# Altium footprint library ConnectMedical.PcbLib: 93 footprints (part 5 of 6)
Each footprint in its own frame and in the unit in brackets; x right, y up, seen from the top. Pads: shape width x height; smd on the part's side, far side on the other; paste and mask are expansions set on the pad; w line width, h text height; cw(c..) or ccw(c..) is an arc to the next point about the centre after c.
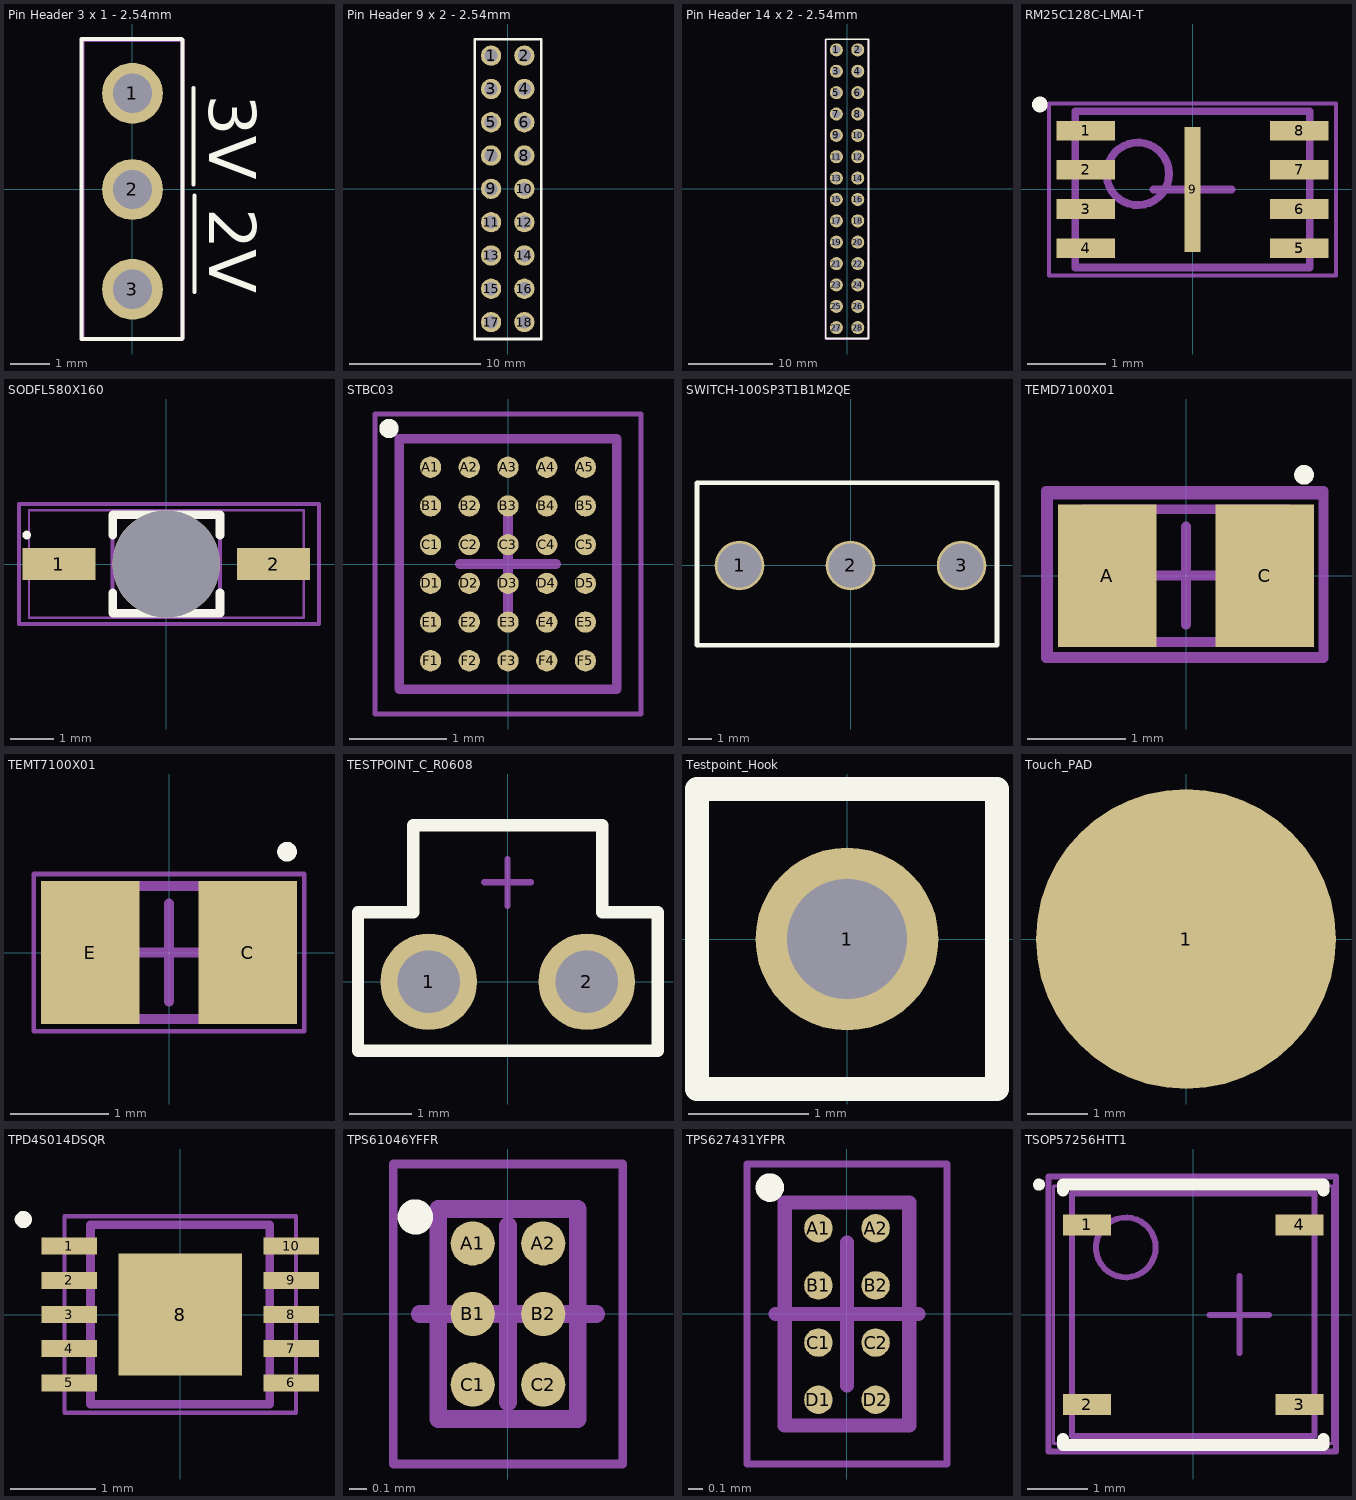
[diagram p4: the footprints below, top view; thin cyan lines are the x and y axes]

## Pin Header 3 x 1 - 2.54mm [mm] "Pin Header 3 X 1 TH 2.54mm Pitch"
pads (3):
  round 1.55 hole 1 paste-3 mask+0.1: 1(0,2.45) 2(0,0) 3(0,-2.54)
Top Overlay:
  lines w0.1: 1.549,0.127 1.549,2.591 ; 1.575,-2.616 1.575,-0.152 ; -1.295,-3.81 1.245,-3.81 1.27,-3.785 1.27,-3.302 1.27,3.81 1.245,3.835 -1.295,3.835 -1.295,-3.81
  text "3V" at 1.956,2.413 h1.2
  text "2V" at 1.956,-0.483 h1.2
Mechanical 14:
  lines w0.1: -1.27,-3.81 -1.27,3.81 1.27,3.81 1.27,-3.81 -1.27,-3.81
  text "'.Designator'" at 0.33,-2.286 h0.76
3D body "STEP-61300311121-rev1.stp": height 8.67, standoff -2.87, extent -1.27,-3.81 1.27,3.81

## Pin Header 9 x 2 - 2.54mm [mm] "Pin Header 9 x 2 TH 2.54mm Pitch"
pads (18):
  round 1.55 hole 1 paste-3 mask+0.1: 1(-1.27,10.16) 2(1.27,10.16) 3(-1.27,7.62) 4(1.27,7.62) 5(-1.27,5.08) 6(1.27,5.08) 7(-1.27,2.54) 8(1.27,2.54) 9(-1.27,0) 10(1.27,0) 11(-1.27,-2.54) 12(1.27,-2.54) 13(-1.27,-5.08) 14(1.27,-5.08) 15(-1.27,-7.62) 16(1.27,-7.62) 17(-1.27,-10.16) 18(1.27,-10.16)
Top Overlay:
  lines w0.2: -2.525,-11.45 2.55,-11.45 2.55,10.015 2.55,11.425 -2.525,11.425 -2.525,-3.01 -2.525,-11.45
Mechanical 14:
  lines w0.1: -2.515,-11.43 2.565,-11.43 2.565,11.43 -2.515,11.43 -2.515,-11.43
  text "'.Designator'" at 0.254,-4.089 h0.76
3D body "Pin Header 9 x 2 TH 2.54mm Pitch.stp": height 8.91, standoff -2.52, extent -2.515,-11.435 2.565,11.425

## Pin Header 14 x 2 - 2.54mm [mm] "Pin Header 14 x 2 TH 2.54mm Pitch"
pads (28):
  round 1.55 hole 1 paste-3 mask+0.1: 1(-1.27,16.51) 2(1.27,16.51) 3(-1.27,13.97) 4(1.27,13.97) 5(-1.27,11.43) 6(1.27,11.43) 7(-1.27,8.89) 8(1.27,8.89) 9(-1.27,6.35) 10(1.27,6.35) 11(-1.27,3.81) 12(1.27,3.81) 13(-1.27,1.27) 14(1.27,1.27) 15(-1.27,-1.27) 16(1.27,-1.27) 17(-1.27,-3.81) 18(1.27,-3.81) 19(-1.27,-6.35) 20(1.27,-6.35) 21(-1.27,-8.89) 22(1.27,-8.89) 23(-1.27,-11.43) 24(1.27,-11.43) 25(-1.27,-13.97) 26(1.27,-13.97) 27(-1.27,-16.51) 28(1.27,-16.51)
Top Overlay:
  lines w0.2: -2.525,-17.8 2.55,-17.8 2.55,16.365 2.55,17.775 -2.525,17.775 -2.525,3.34 -2.525,-17.8
Mechanical 14:
  lines w0.1: -2.565,-17.831 -2.565,17.78 -2.54,17.805 2.54,17.805 2.54,17.729 2.54,-17.856 -2.54,-17.856 -2.565,-17.831
  text "'.Designator'" at 0.279,-4.597 h0.76
3D body "Pin Header 14 x 2 TH 2.54mm Pitch.stp": height 8.91, standoff -2.52, extent -2.515,-17.785 2.565,17.775

## RM25C128C-LMAI-T [mm] "IC EEPROM 128KBIT 10MHZ 8DFN"
height 0.6
pads (9):
  rect 0.75x0.25 smd: 1(-1.365,0.75) 2(-1.365,0.25) 3(-1.365,-0.25) 4(-1.365,-0.75) 5(1.365,-0.75) 6(1.365,-0.25) 7(1.365,0.25) 8(1.365,0.75)
  rect 0.2x1.6 smd: 9(0,0)
Top Overlay:
  circle w0.1: c-1.952,1.087 r0.05
Mechanical 13:
  circle w0.1: c-0.7,0.2 r0.4
  lines w0.1: -1.5,-1 -1.5,1 1.5,1 1.5,-1 -1.5,-1
Mechanical 15:
  lines w0.05: -1.835,-1.1 -1.835,1.1 1.835,1.1 1.835,-1.1 -1.835,-1.1
  lines w0.1: -0.5,0 0.5,0 ; 0,-0.5 0,0.5
3D body "RM25C128C-LMAI-T.step": height 0.6, standoff 0, extent -1.55,-1 1.55,1

## SODFL580X160 [mm] "SODFL, 2-Leads, Body 2.20x5.80mm, IPC High Density"
height 1.6
pads (3):
  rect 1.7x0.75 smd: 1(-2.5,0) 2(2.5,0)
  round 2.5 hole 2.5 unplated: ""(0,0)
Top Overlay:
  circle w0.1: c-3.25,0.675 r0.05
  lines w0.2: -1.25,-0.675 -1.25,-1.15 1.25,-1.15 1.25,-0.675 ; -1.25,0.675 -1.25,1.15 1.25,1.15 1.25,0.675
Mechanical 13:
  lines w0.1: -1.25,-1.15 -1.25,1.15 1.25,1.15 1.25,-1.15 -1.25,-1.15
Mechanical 14:
  lines w0.1: -3.429,-1.397 -3.429,1.397 3.556,1.397 3.556,-1.397 -3.429,-1.397
  text "'.Designator'" at -2.261,-0.305 h0.76
Mechanical 15:
  lines w0.05: -3.2,-1.25 -3.2,1.25 3.2,1.25 3.2,-1.25 -3.2,-1.25
  lines w0.1: -0.5,0 0.5,0 ; 0,-0.5 0,0.5
3D body "SODFL580X160-2L.step": height 1.6, standoff 0, extent -2.9,-1.15 2.9,1.15
3D body: height 0, standoff -1.17, extent -0.943,-0.948 0.95,0.948

## STBC03 [mm] "Li-Ion linear battery charger with LDO and load switches"
height 0.6
pads (30):
  round 0.22 smd mask+0.04: A1(-0.8,1) A2(-0.4,1) A3(0,1) A4(0.4,1) A5(0.8,1) B1(-0.8,0.6) B2(-0.4,0.6) B3(0,0.6) B4(0.4,0.6) B5(0.8,0.6) C1(-0.8,0.2) C2(-0.4,0.2) C3(0,0.2) C4(0.4,0.2) C5(0.8,0.2) D1(-0.8,-0.2) D2(-0.4,-0.2) D3(0,-0.2) D4(0.4,-0.2) D5(0.8,-0.2) E1(-0.8,-0.6) E2(-0.4,-0.6) E3(0,-0.6) E4(0.4,-0.6) E5(0.8,-0.6) F1(-0.8,-1) F2(-0.4,-1) F3(0,-1) F4(0.4,-1) F5(0.8,-1)
Top Overlay:
  circle w0.1: c-1.23,1.4 r0.05
Mechanical 13:
  lines w0.1: -1.125,-1.295 1.125,-1.295 1.125,1.295 -1.125,1.295 -1.125,-1.295
Mechanical 14:
  lines w0.05: -1.375,-1.55 1.375,-1.55 1.375,1.55 -1.375,1.55 -1.375,-1.55
  text "'.Designator'" at -1.448,-0.305 h0.76
Mechanical 15:
  lines w0.05: -1.375,-1.55 -1.375,1.55 1.375,1.55 1.375,-1.55 -1.375,-1.55
  lines w0.1: -0.5,0 0.5,0 ; 0,-0.5 0,0.5
3D body "STBC03_2.step": height 0.6, standoff 0, extent -1.125,-1.295 1.125,1.295

## SWITCH-100SP3T1B1M2QE [mm] "SWITCH TOGGLE SPDT"
pads (3):
  round 2.1 hole 1.85 paste-3 mask+0.1: 1(-4.7,0) 2(0,0) 3(4.7,0)
Top Overlay:
  lines w0.2: -6.5,-3.375 -6.5,3.5 6.2,3.5 6.2,-3.375 -6.5,-3.375
3D body "100SPxT1B1M2xE.stp": height 29.46, standoff -5.06, extent -6.5,-3.38 6.2,3.48

## TEMD7100X01 [mm] "Silicon PIN Photodiode, 2-Leads, Body 2.00x1.25mm, IPC High Density"
height 0.95
pads (2):
  rect 1x1.45 smd: A(-0.8,0) C(0.8,0)
Top Overlay:
  circle w0.1: c1.2,1.025 r0.05
Mechanical 13:
  rectangle: 0.768,-0.675 1.05,0.675
  lines w0.1: -1.05,-0.675 1.05,-0.675 1.05,0.675 -1.05,0.675 -1.05,-0.675
Mechanical 14:
  lines w0.1: -1.422,-0.838 -1.422,0.864 1.397,0.864 1.397,-0.838 -1.422,-0.838
  text "'.Designator'" at -1.626,-0.406 h0.76
Mechanical 15:
  lines w0.05: -1.375,-0.8 1.375,-0.8 1.375,0.8 -1.375,0.8 -1.375,-0.8
  lines w0.1: -0.5,0 0.5,0 ; 0,-0.5 0,0.5
3D body "TEMD7100X01 .step": height 0.95, standoff 0, extent -1.27,-0.675 1.27,0.675

## TEMT7100X01 [mm] "Silicon Phototransistor in 0805 Package, 2-Leads, Body 2.00x1.25mm, IPC High Density"
height 0.95
pads (2):
  rect 1x1.45 smd: C(0.8,0) E(-0.8,0)
Top Overlay:
  circle w0.1: c1.2,1.025 r0.05
Mechanical 13:
  rectangle: 0.768,-0.675 1.05,0.675
  lines w0.1: -1.05,-0.675 1.05,-0.675 1.05,0.675 -1.05,0.675 -1.05,-0.675
Mechanical 15:
  lines w0.05: -1.375,-0.8 1.375,-0.8 1.375,0.8 -1.375,0.8 -1.375,-0.8
  lines w0.1: -0.5,0 0.5,0 ; 0,-0.5 0,0.5
3D body "TEMD7100X01 .step": height 0.95, standoff 0, extent -1.27,-0.675 1.27,0.675

## TESTPOINT_C_R0608 [mm] "Testpoint current"
pads (2):
  round 1.55 hole 1 paste-3 mask+0.1: 1(-1.27,0) 2(1.27,0)
Top Overlay:
  lines w0.2: -2.405,-1.107 2.408,-1.107 2.408,1.115 1.52,1.115 1.52,2.516 -1.52,2.516 -1.52,1.115 -2.405,1.115 -2.405,-1.107
Mechanical 14:
  lines w0.1: -2.362,-1.143 -2.362,1.143 -1.499,1.143 -1.499,2.489 1.524,2.489 1.524,1.168 1.549,1.143 2.413,1.143 2.413,-1.118 2.388,-1.143 -2.362,-1.143
  text "'.Designator'" at -2.591,-0.483 h0.76
Mechanical 15:
  lines w0.05: -1.353,2.447 1.347,2.447
  lines w0.1: -0.378,1.597 0.372,1.597 ; -0.003,1.222 -0.003,1.972

## Testpoint_Hook [mil] "Testpoints"
pads (1):
  round 60 hole 39.37: 1(0,0)
Top Overlay:
  lines w7.87: -49.21,-49.21 49.21,-49.21 49.21,49.21 -49.21,49.21 -49.21,-49.21
Mechanical 14:
  text "'.Designator'" at -63,-24 h30
3D body "TEST POINT GRY Keystone 5118.STEP": height 192.34, standoff -121.02, extent -49.99,-49.99 50.01,50.01

## Touch_PAD [mm]
pads (1):
  round 5 smd: 1(0,0)

## TPD4S014DSQR [mm] "IC USB PORT PROTECTION 10SON"
height 0.8
pads (11):
  rect 0.65x0.2 smd mask+0.07: 1(-1.3,0.8) 2(-1.3,0.4) 3(-1.3,0) 4(-1.3,-0.4) 5(-1.3,-0.8) 6(1.3,-0.8) 7(1.3,-0.4) 8(1.3,0) 9(1.3,0.4) 10(1.3,0.8)
  rect 1.45x1.43 smd mask+0.07: 8(0,0)
Top Overlay:
  circle w0.1: c-1.837,1.112 r0.05
Mechanical 13:
  circle w0.1: c-0.25,0.25 r0.4
  lines w0.1: -1.05,-1.05 -1.05,1.05 1.05,1.05 1.05,-1.05 -1.05,-1.05
Mechanical 15:
  lines w0.05: -1.355,-1.15 -1.355,1.15 1.355,1.15 1.355,-1.15 -1.355,-1.15
  lines w0.1: -0.5,0 0.5,0 ; 0,-0.5 0,0.5
3D body "TPD4S014DSQR.step": height 0.8, standoff 0, extent -1.1,-1.05 1.1,1.05

## TPS61046YFFR [mm] "IC LED DRVR RGLTR DIM"
height 0.63
pads (6):
  round 0.25 smd mask+0.045: A1(-0.2,0.4) A2(0.2,0.4) B1(-0.2,0) B2(0.2,0) C1(-0.2,-0.4) C2(0.2,-0.4)
Top Overlay:
  circle w0.1: c-0.525,0.55 r0.05
Mechanical 13:
  lines w0.1: -0.395,-0.595 -0.395,0.595 0.395,0.595 0.395,-0.595 -0.395,-0.595
Mechanical 14:
  text "'.Designator'" at 0.33,-1.219 h0.64
Mechanical 15:
  lines w0.05: -0.65,-0.85 -0.65,0.85 0.65,0.85 0.65,-0.85 -0.65,-0.85
  lines w0.1: -0.5,0 0.5,0 ; 0,-0.5 0,0.5
3D body "TPS61046YFFR.step": height 0.63, standoff 0, extent -0.395,-0.595 0.395,0.595

## TPS627431YFPR [mm] "IC REG BCK PROG 0.4A SYNC 8DSBGA"
height 0.5
pads (8):
  round 0.2 smd mask+0.07: A1(-0.2,0.6) A2(0.2,0.6) B1(-0.2,0.2) B2(0.2,0.2) C1(-0.2,-0.2) C2(0.2,-0.2) D1(-0.2,-0.6) D2(0.2,-0.6)
Top Overlay:
  circle w0.1: c-0.54,0.885 r0.05
Mechanical 13:
  lines w0.1: -0.435,-0.78 0.435,-0.78 0.435,0.78 -0.435,0.78 -0.435,-0.78
Mechanical 14:
  lines w0.05: -0.7,-1.05 0.7,-1.05 0.7,1.05 -0.7,1.05 -0.7,-1.05
  text "'.Designator'" at 0.406,-1.422 h0.76
Mechanical 15:
  lines w0.05: -0.7,-1.05 -0.7,1.05 0.7,1.05 0.7,-1.05 -0.7,-1.05
  lines w0.1: -0.5,0 0.5,0 ; 0,-0.5 0,0.5
3D body "TPS627431YFPR.step": height 0.5, standoff 0, extent -0.435,-0.78 0.435,0.78

## TSOP57256HTT1 [mm] "IR Receiver Modules ,SON, 4-Leads, Body 3.95x3.95mm, Pitch 3.00mm, IPC High Density"
height 0.9
pads (4):
  rect 0.8x0.35 smd: 1(-1.775,1.5) 2(-1.775,-1.5) 3(1.775,-1.5) 4(1.775,1.5)
Top Overlay:
  circle w0.1: c-2.575,2.175 r0.05
  lines w0.2: -2.175,-2.075 -2.175,-2.175 2.175,-2.175 2.175,-2.075 ; -2.175,2.075 -2.175,2.175 2.175,2.175 2.175,2.075
Mechanical 13:
  circle w0.1: c-1.125,1.125 r0.5
  lines w0.1: -2.025,-2.025 -2.025,2.025 2.025,2.025 2.025,-2.025 -2.025,-2.025
Mechanical 14:
  lines w0.1: -2.413,-2.286 -2.413,2.311 2.388,2.311 2.388,-2.286 -2.413,-2.286
  text "'.Designator'" at -2.362,-0.381 h0.76
Mechanical 15:
  lines w0.05: -2.33,-2.15 -2.33,2.15 2.33,2.15 2.33,-2.15 -2.33,-2.15
  lines w0.1: 0.27,0 1.27,0 ; 0.775,-0.635 0.775,0.644
3D body "TSOP57256HTT1.step": height 0.9, standoff 0, extent -2.075,-2.025 2.075,2.025